# Altium footprint library 13-IC Packages-2smt4e.PcbLib: 49 footprints (part 2 of 4)
Each footprint in its own frame and in the unit in brackets; x right, y up, seen from the top. Pads: shape width x height; smd on the part's side, far side on the other; paste and mask are expansions set on the pad; w line width, h text height; cw(c..) or ccw(c..) is an arc to the next point about the centre after c.
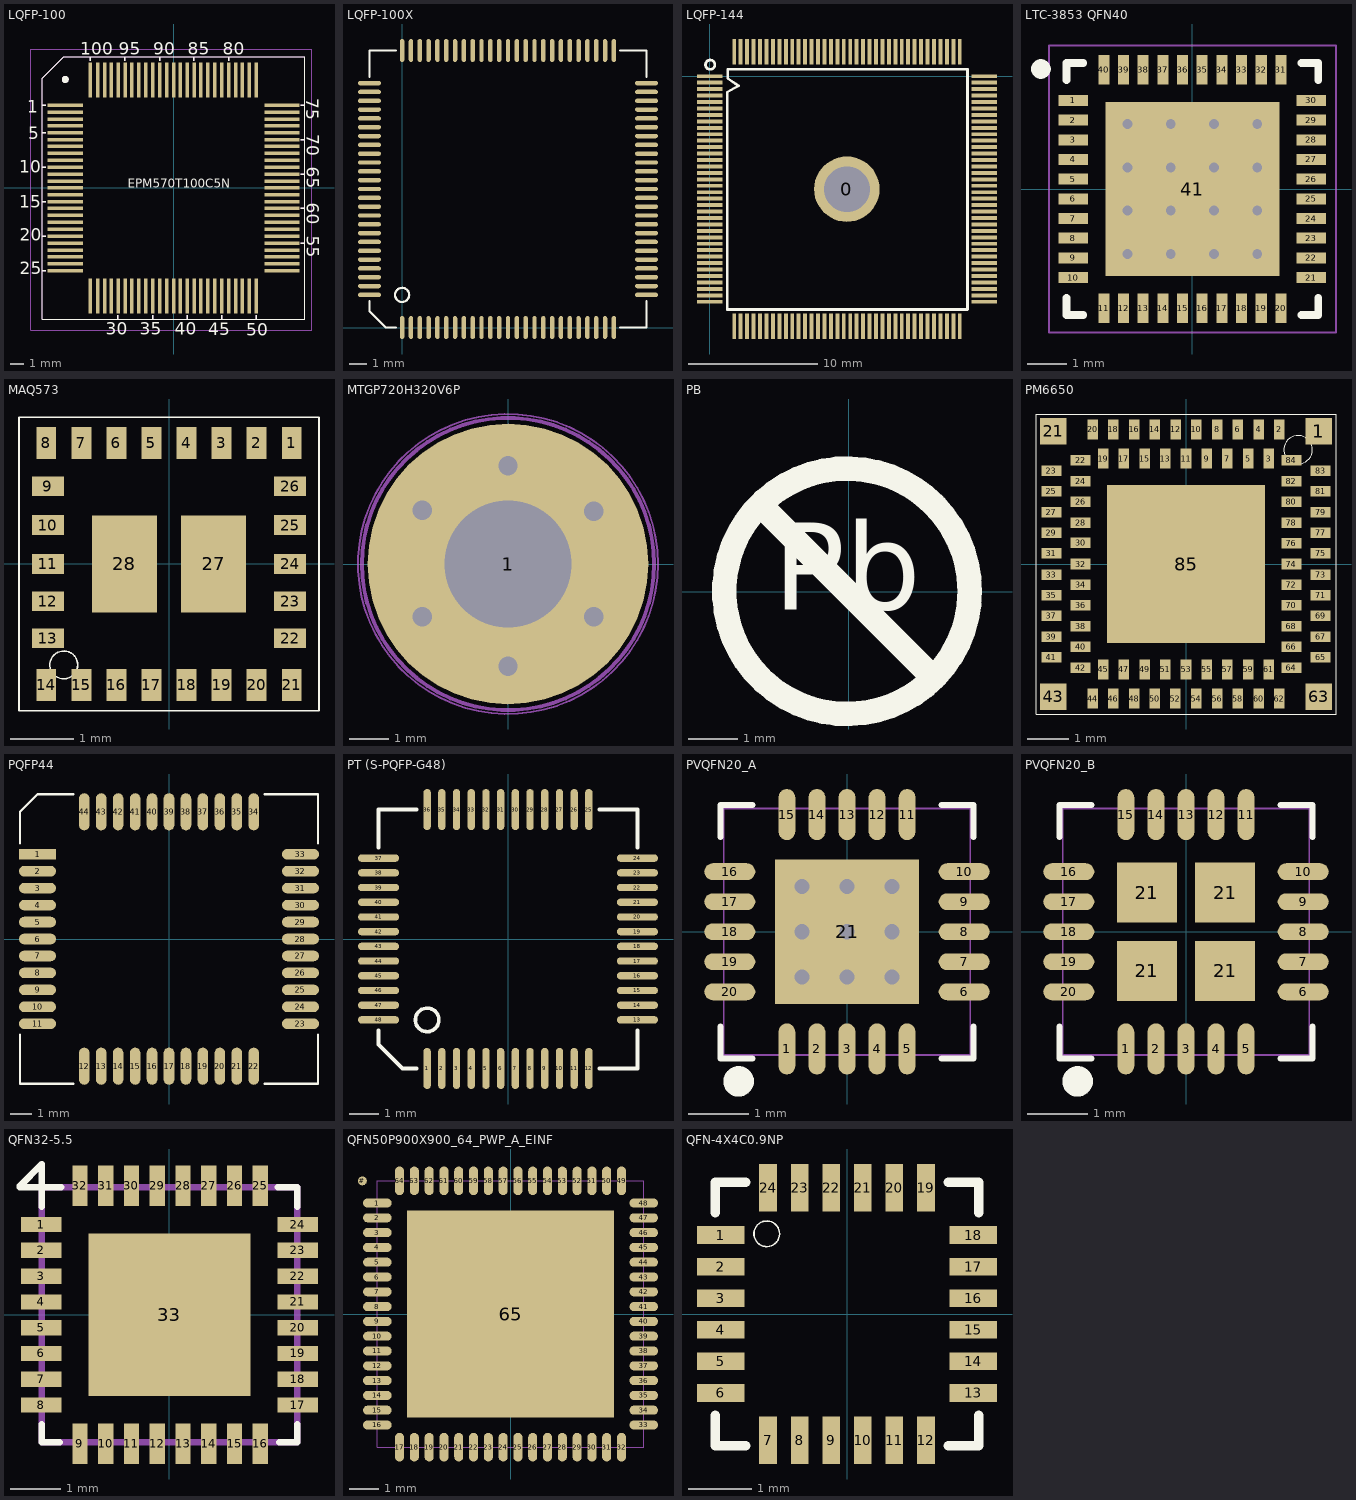
[diagram p1: the footprints below, top view; thin cyan lines are the x and y axes]

## LQFP-100 [mil]
pads (100):
  rect 100x10 smd: 1(-309.02,236.5) 2(-309.02,216.5) 3(-309.02,196.5) 4(-309.02,177.48) 5(-309.02,157.48) 6(-309.02,137.48) 7(-309.02,118.5) 8(-309.02,98.5) 9(-309.02,78.5) 10(-309.02,59.49) 11(-309.02,39.49) 12(-309.02,19.49) 13(-309.02,0.51) 14(-309.02,-19.49) 15(-309.02,-39.49) 16(-309.02,-58.5) 17(-309.02,-78.5) 18(-309.02,-98.5) 19(-309.02,-118.5) 20(-309.02,-137.48) 21(-309.02,-157.48) 22(-309.02,-177.48) 23(-309.02,-196.5) 24(-309.02,-216.5) 25(-309.02,-236.5) 51(309.02,-236.5) 52(309.02,-216.5) 53(309.02,-196.5) 54(309.02,-177.48) 55(309.02,-157.48) 56(309.02,-137.48) 57(309.02,-118.5) 58(309.02,-98.5) 59(309.02,-78.5) 60(309.02,-58.5) 61(309.02,-39.49) 62(309.02,-19.49) 63(309.02,0.51) 64(309.02,19.49) 65(309.02,39.49) 66(309.02,59.49) 67(309.02,78.5) 68(309.02,98.5) 69(309.02,118.5) 70(309.02,137.48) 71(309.02,157.48) 72(309.02,177.48) 73(309.02,196.5) 74(309.02,216.5) 75(309.02,236.5)
  rect 10x100 smd: 26(-237.01,-308.5) 27(-217.01,-308.5) 28(-197.01,-308.5) 29(-177.99,-308.5) 30(-157.99,-308.5) 31(-137.99,-308.5) 32(-119.02,-308.5) 33(-99.02,-308.5) 34(-79.02,-308.5) 35(-59.02,-308.5) 36(-40,-308.5) 37(-20,-308.5) 38(0,-308.5) 39(19.02,-308.5) 40(39.02,-308.5) 41(59.02,-308.5) 42(77.99,-308.5) 43(97.99,-308.5) 44(117.99,-308.5) 45(137.01,-308.5) 46(157.01,-308.5) 47(177.01,-308.5) 48(195.98,-308.5) 49(215.98,-308.5) 50(235.98,-308.5) 76(235.98,308.5) 77(215.98,308.5) 78(195.98,308.5) 79(177.01,308.5) 80(157.01,308.5) 81(137.01,308.5) 82(117.99,308.5) 83(97.99,308.5) 84(77.99,308.5) 85(59.02,308.5) 86(39.02,308.5) 87(19.02,308.5) 88(0,308.5) 89(-20,308.5) 90(-40,308.5) 91(-59.02,308.5) 92(-79.02,308.5) 93(-99.02,308.5) 94(-119.02,308.5) 95(-137.99,308.5) 96(-157.99,308.5) 97(-177.99,308.5) 98(-197.01,308.5) 99(-217.01,308.5) 100(-237.01,308.5)
Top Overlay:
  circle w10: c-309.01,309.5 r4.99
  lines w2.01: -375,-374.49 -375,312.52 -312.99,374.49 373.98,374.49 373.98,-374.49 -375,-374.49
  lines w4.02: -375,157.52 -365,157.52 ; -375,236.5 -365,236.5 ; -374.02,-236.5 -364.02,-236.5 ; -374.02,-137.48 -364.02,-137.48 ; -374.02,-39.49 -364.02,-39.49 ; -374.02,59.49 -364.02,59.49 ; -237.99,363.5 -237.99,373.5 ; -159.02,-373.5 -159.02,-363.5 ; -139.02,363.5 -139.02,373.5 ; -59.02,-373.5 -59.02,-363.5 ; -40,363.5 -40,373.5 ; 38.98,-373.5 38.98,-363.5 ; 57.99,363.5 57.99,373.5 ; 137.01,-373.5 137.01,-363.5 ; 157.01,363.5 157.01,373.5 ; 235.98,-373.5 235.98,-363.5 ; 362.99,-157.48 372.99,-157.48 ; 362.99,-58.5 372.99,-58.5 ; 362.99,39.49 372.99,39.49 ; 362.99,137.52 372.99,137.52 ; 362.99,236.5 372.99,236.5
  text "70" at 380,152.52 h35
  text "65" at 380,60.51 h35
  text "10" at -441.02,43.5 h35
  text "5" at -415,138.5 h35
  text "85" at 40,379.49 h35
  text "80" at 140,380.51 h35
  text "40" at 3.98,-419.49 h35
  text "95" at -157.01,380.51 h35
  text "90" at -57.99,379.49 h35
  text "75" at 377.99,256.5 h35
  text "60" at 380,-42.48 h35
  text "55" at 380,-136.5 h35
  text "50" at 207.01,-421.5 h35
  text "45" at 98.98,-420.51 h35
  text "35" at -96.02,-419.49 h35
  text "30" at -194.02,-419.49 h35
  text "25" at -439.02,-246.5 h35
  text "20" at -439.02,-150.51 h35
  text "15" at -440,-56.5 h35
  text "1" at -417.01,214.49 h35
  text "100" at -266.02,380.51 h35
  text "EPM570T100C5N" at -130,0 h25
Mechanical 7:
  text "50" at 215.98,-308.5 h25
  text "14" at -329.02,-19.49 h25
  text "31" at -157.99,-308.5 h25
  text "45" at 117.01,-308.5 h25
  text "39" at -1.02,-308.5 h25
  text "9" at -319.02,78.5 h25
  text "13" at -329.02,0.51 h25
  text "63" at 288.98,0.51 h25
  text "59" at 288.98,-78.5 h25
  text "88" at -20,308.5 h25
  text "94" at -139.02,308.5 h25
  text "80" at 137.01,308.5 h25
  text "75" at 288.98,236.5 h25
  text "74" at 288.98,216.5 h25
  text "62" at 288.98,-19.49 h25
  text "12" at -329.02,19.49 h25
  text "52" at 288.98,-216.5 h25
  text "40" at 18.98,-308.5 h25
  text "68" at 288.98,98.5 h25
  text "69" at 288.98,118.5 h25
  text "70" at 288.98,137.52 h25
  text "71" at 288.98,157.52 h25
  text "72" at 288.98,177.52 h25
  text "73" at 288.98,196.5 h25
  text "92" at -99.02,308.5 h25
  text "91" at -79.02,308.5 h25
  text "77" at 195.98,308.5 h25
  text "36" at -60,-308.5 h25
  text "6" at -319.02,137.52 h25
  text "79" at 157.01,308.5 h25
  text "90" at -60,308.5 h25
  text "93" at -119.02,308.5 h25
  text "11" at -329.02,39.49 h25
  text "32" at -139.02,-308.5 h25
  text "46" at 137.01,-308.5 h25
  text "37" at -40,-308.5 h25
  text "10" at -329.02,59.49 h25
  text "65" at 288.98,39.49 h25
  text "60" at 288.98,-58.5 h25
  text "2" at -319.02,216.5 h25
  text "85" at 38.98,308.5 h25
  text "17" at -329.02,-78.5 h25
  text "82" at 97.99,308.5 h25
  text "16" at -329.02,-58.5 h25
  text "86" at 18.98,308.5 h25
  text "19" at -329.02,-118.5 h25
  text "84" at 57.99,308.5 h25
  text "24" at -329.02,-216.5 h25
  text "23" at -329.02,-196.5 h25
  text "25" at -329.02,-236.5 h25
  text "22" at -329.02,-177.48 h25
  text "55" at 288.98,-157.48 h25
  text "57" at 288.98,-118.5 h25
  text "58" at 288.98,-98.5 h25
  text "99" at -237.01,308.5 h25
  text "95" at -157.99,308.5 h25
  text "44" at 97.99,-308.5 h25
  text "43" at 77.99,-308.5 h25
  text "66" at 288.98,59.49 h25
  text "67" at 288.98,78.5 h25
  text "47" at 157.01,-308.5 h25
  text "48" at 175.98,-308.5 h25
  text "89" at -40,308.5 h25
  text "38" at -20,-308.5 h25
  text "54" at 288.98,-177.48 h25
  text "56" at 288.98,-137.48 h25
  text "61" at 288.98,-39.49 h25
  text "51" at 288.98,-236.5 h25
  text "78" at 175.98,308.5 h25
  text "35" at -79.02,-308.5 h25
  text "34" at -99.02,-308.5 h25
  text "29" at -197.99,-308.5 h25
  text "27" at -237.01,-308.5 h25
  text "28" at -217.01,-308.5 h25
  text "33" at -119.02,-308.5 h25
  text "20" at -329.02,-137.48 h25
  text "21" at -329.02,-157.48 h25
  text "98" at -217.01,308.5 h25
  text "42" at 57.99,-308.5 h25
  text "76" at 215.98,308.5 h25
  text "41" at 38.98,-308.5 h25
  text "15" at -329.02,-39.49 h25
  text "87" at -1.02,308.5 h25
  text "18" at -329.02,-98.5 h25
  text "83" at 77.99,308.5 h25
  text "8" at -319.02,98.5 h25
  text "7" at -319.02,118.5 h25
  text "5" at -319.02,157.52 h25
  text "4" at -319.02,177.52 h25
  text "3" at -319.02,196.5 h25
  text "1" at -319.02,236.5 h25
  text "26" at -257.01,-308.5 h25
  text "100" at -267.01,308.5 h25
  text "97" at -197.99,308.5 h25
  text "30" at -177.99,-308.5 h25
  text "96" at -177.99,308.5 h25
  text "81" at 117.01,308.5 h25
  text "49" at 195.98,-308.5 h25
  text "53" at 288.98,-196.5 h25
  text "64" at 288.98,19.49 h25
Mechanical 9:
  lines w1: -407.01,-406.5 395,-406.5 395,395.51 -407.01,395.51 -407.01,-406.5
Mechanical 10:
  lines w2.01: -375,-374.49 373.98,-374.49 373.98,374.49 -312.99,374.49 -375,312.52 -375,-374.49
  lines w4.02: -375,157.52 -365,157.52 ; -375,236.5 -365,236.5 ; -374.02,-236.5 -364.02,-236.5 ; -374.02,-137.48 -364.02,-137.48 ; -374.02,-39.49 -364.02,-39.49 ; -374.02,59.49 -364.02,59.49 ; -237.99,363.5 -237.99,373.5 ; -159.02,-373.5 -159.02,-363.5 ; -139.02,363.5 -139.02,373.5 ; -59.02,-373.5 -59.02,-363.5 ; -40,363.5 -40,373.5 ; 38.98,-373.5 38.98,-363.5 ; 57.99,363.5 57.99,373.5 ; 137.01,-373.5 137.01,-363.5 ; 157.01,363.5 157.01,373.5 ; 235.98,-373.5 235.98,-363.5 ; 362.99,-157.48 372.99,-157.48 ; 362.99,-58.5 372.99,-58.5 ; 362.99,39.49 372.99,39.49 ; 362.99,137.52 372.99,137.52 ; 362.99,236.5 372.99,236.5
  lines w10: -314,309.5 ccw(c-309.01,309.51) -309.01,304.52 ccw(c-309.01,309.51) -304.02,309.5 ccw(c-309.01,309.5) -309.01,314.49 ccw(c-309.01,309.5) -314,309.5
  text "100" at -266.02,380.51 h35
  text "1" at -417.01,214.49 h35
  text "15" at -440,-56.5 h35
  text "20" at -439.02,-150.51 h35
  text "25" at -439.02,-246.5 h35
  text "30" at -194.02,-419.49 h35
  text "35" at -96.02,-419.49 h35
  text "45" at 98.98,-420.51 h35
  text "50" at 207.01,-421.5 h35
  text "55" at 380,-136.5 h35
  text "60" at 380,-42.48 h35
  text "75" at 377.99,256.5 h35
  text "90" at -57.99,379.49 h35
  text "95" at -157.01,380.51 h35
  text "40" at 3.98,-419.49 h35
  text "80" at 140,380.51 h35
  text "85" at 40,379.49 h35
  text "5" at -415,138.5 h35
  text "10" at -441.02,43.5 h35
  text "65" at 380,60.51 h35
  text "70" at 380,152.52 h35
Mechanical 11:
  lines w1: -407.01,-406.5 395,-406.5 395,395.51 -407.01,395.51 -407.01,-406.5
3D body "lqfp-100.stp": height 62.99, standoff 0.05, extent -313.95,-315.96 315.97,313.96

## LQFP-100X [mm] "STM32107V.."
pads (100):
  oval 0.25x1.3 smd: 1(0,0) 2(0.5,0) 3(1,0) 4(1.5,0) 5(2,0) 6(2.5,0) 7(3,0) 8(3.5,0) 9(4,0) 10(4.5,0) 11(5,0) 12(5.5,0) 13(6,0) 14(6.5,0) 15(7,0) 16(7.5,0) 17(8,0) 18(8.5,0) 19(9,0) 20(9.5,0) 21(10,0) 22(10.5,0) 23(11,0) 24(11.5,0) 25(12,0) 51(12,15.7) 52(11.5,15.7) 53(11,15.7) 54(10.5,15.7) 55(10,15.7) 56(9.5,15.7) 57(9,15.7) 58(8.5,15.7) 59(8,15.7) 60(7.5,15.7) 61(7,15.7) 62(6.5,15.7) 63(6,15.7) 64(5.5,15.7) 65(5,15.7) 66(4.5,15.7) 67(4,15.7) 68(3.5,15.7) 69(3,15.7) 70(2.5,15.7) 71(2,15.7) 72(1.5,15.7) 73(1,15.7) 74(0.5,15.7) 75(0,15.7)
  oval 1.3x0.25 smd: 26(13.85,1.85) 27(13.85,2.35) 28(13.85,2.85) 29(13.85,3.35) 30(13.85,3.85) 31(13.85,4.35) 32(13.85,4.85) 33(13.85,5.35) 34(13.85,5.85) 35(13.85,6.35) 36(13.85,6.85) 37(13.85,7.35) 38(13.85,7.85) 39(13.85,8.35) 40(13.85,8.85) 41(13.85,9.35) 42(13.85,9.85) 43(13.85,10.35) 44(13.85,10.85) 45(13.85,11.35) 46(13.85,11.85) 47(13.85,12.35) 48(13.85,12.85) 49(13.85,13.35) 50(13.85,13.85) 76(-1.85,13.85) 77(-1.85,13.35) 78(-1.85,12.85) 79(-1.85,12.35) 80(-1.85,11.85) 81(-1.85,11.35) 82(-1.85,10.85) 83(-1.85,10.35) 84(-1.85,9.85) 85(-1.85,9.35) 86(-1.85,8.85) 87(-1.85,8.35) 88(-1.85,7.85) 89(-1.85,7.35) 90(-1.85,6.85) 91(-1.85,6.35) 92(-1.85,5.85) 93(-1.85,5.35) 94(-1.85,4.85) 95(-1.85,4.35) 96(-1.85,3.85) 97(-1.85,3.35) 98(-1.85,2.85) 99(-1.85,2.35) 100(-1.85,1.85)
Top Overlay:
  circle w0.127: c0,1.85 r0.4
  lines w0.127: -1.85,1.5 -1.85,0.92 -0.93,0 -0.35,0 ; -1.85,14.2 -1.85,15.7 -0.35,15.7 ; 12.35,0 13.85,0 13.85,1.5 ; 12.35,15.7 13.85,15.7 13.85,14.2
3D body "lqfp-100.stp": height 1.6, standoff 0, extent -2.005,-0.151 13.995,15.849

## LQFP-144 [mil]
pads (145):
  round 200 hole 140: 0(418.8,-345.07)
  rect 78x12 smd: 1(0,0) 2(0,-19.68) 3(0,-39.37) 4(0,-59.05) 5(0,-78.74) 6(0,-98.42) 7(0,-118.11) 8(0,-137.79) 9(0,-157.48) 10(0,-177.16) 11(0,-196.85) 12(0,-216.53) 13(0,-236.22) 14(0,-255.91) 15(0,-275.59) 16(0,-295.27) 17(0,-314.96) 18(0,-334.64) 19(0,-354.33) 20(0,-374.01) 21(0,-393.7) 22(0,-413.38) 23(0,-433.07) 24(0,-452.75) 25(0,-472.44) 26(0,-492.12) 27(0,-511.81) 28(0,-531.5) 29(0,-551.18) 30(0,-570.87) 31(0,-590.55) 32(0,-610.24) 33(0,-629.92) 34(0,-649.61) 35(0,-669.29) 36(0,-688.98) 73(838.58,-688.98) 74(838.58,-669.29) 75(838.58,-649.61) 76(838.58,-629.92) 77(838.58,-610.24) 78(838.58,-590.55) 79(838.58,-570.87) 80(838.58,-551.18) 81(838.58,-531.5) 82(838.58,-511.81) 83(838.58,-492.12) 84(838.58,-472.44) 85(838.58,-452.75) 86(838.58,-433.07) 87(838.58,-413.38) 88(838.58,-393.7) 89(838.58,-374.01) 90(838.58,-354.33) 91(838.58,-334.64) 92(838.58,-314.96) 93(838.58,-295.27) 94(838.58,-275.59) 95(838.58,-255.91) 96(838.58,-236.22) 97(838.58,-216.53) 98(838.58,-196.85) 99(838.58,-177.16) 100(838.58,-157.48) 101(838.58,-137.79) 102(838.58,-118.11) 103(838.58,-98.42) 104(838.58,-78.74) 105(838.58,-59.05) 106(838.58,-39.37) 107(838.58,-19.68) 108(838.58,0)
  rect 12x78 smd: 37(74.8,-763.78) 38(94.49,-763.78) 39(114.17,-763.78) 40(133.86,-763.78) 41(153.54,-763.78) 42(173.23,-763.78) 43(192.91,-763.78) 44(212.6,-763.78) 45(232.28,-763.78) 46(251.97,-763.78) 47(271.65,-763.78) 48(291.34,-763.78) 49(311.02,-763.78) 50(330.71,-763.78) 51(350.39,-763.78) 52(370.08,-763.78) 53(389.76,-763.78) 54(409.45,-763.78) 55(429.13,-763.78) 56(448.82,-763.78) 57(468.5,-763.78) 58(488.19,-763.78) 59(507.87,-763.78) 60(527.56,-763.78) 61(547.24,-763.78) 62(566.93,-763.78) 63(586.61,-763.78) 64(606.3,-763.78) 65(625.98,-763.78) 66(645.67,-763.78) 67(665.35,-763.78) 68(685.04,-763.78) 69(704.72,-763.78) 70(724.41,-763.78) 71(744.09,-763.78) 72(763.78,-763.78) 109(763.78,74.8) 110(744.09,74.8) 111(724.41,74.8) 112(704.72,74.8) 113(685.04,74.8) 114(665.35,74.8) 115(645.67,74.8) 116(625.98,74.8) 117(606.3,74.8) 118(586.61,74.8) 119(566.93,74.8) 120(547.24,74.8) 121(527.56,74.8) 122(507.87,74.8) 123(488.19,74.8) 124(468.5,74.8) 125(448.82,74.8) 126(429.13,74.8) 127(409.45,74.8) 128(389.76,74.8) 129(370.08,74.8) 130(350.39,74.8) 131(330.71,74.8) 132(311.02,74.8) 133(291.34,74.8) 134(271.65,74.8) 135(251.97,74.8) 136(232.28,74.8) 137(212.6,74.8) 138(192.91,74.8) 139(173.23,74.8) 140(153.54,74.8) 141(133.86,74.8) 142(114.17,74.8) 143(94.49,74.8) 144(74.8,74.8)
Top Overlay:
  circle w8: c1.42,35.27 r14.34
  lines w8: 53.03,-712.66 787.61,-712.66 787.61,-180.71 787.61,21.71 55.26,21.71 55.26,-6.63 87.85,-28.89 53.03,-48.33 53.03,-712.66
3D body "quad144.stp": height 59.06, standoff 0, extent -14.07,-778.08 852.08,88.07

## LTC-3853 QFN40 [mm]
pads (41):
  rect 0.75x0.28 smd: 1(-3.025,2.25) 2(-3.025,1.75) 3(-3.025,1.25) 4(-3.025,0.75) 5(-3.025,0.25) 6(-3.025,-0.25) 7(-3.025,-0.75) 8(-3.025,-1.25) 9(-3.025,-1.75) 10(-3.025,-2.25) 21(3.025,-2.25) 22(3.025,-1.75) 23(3.025,-1.25) 24(3.025,-0.75) 25(3.025,-0.25) 26(3.025,0.25) 27(3.025,0.75) 28(3.025,1.25) 29(3.025,1.75) 30(3.025,2.25)
  rect 0.28x0.75 smd: 11(-2.25,-3.025) 12(-1.75,-3.025) 13(-1.25,-3.025) 14(-0.75,-3.025) 15(-0.25,-3.025) 16(0.25,-3.025) 17(0.75,-3.025) 18(1.25,-3.025) 19(1.75,-3.025) 20(2.25,-3.025) 31(2.25,3.025) 32(1.75,3.025) 33(1.25,3.025) 34(0.75,3.025) 35(0.25,3.025) 36(-0.25,3.025) 37(-0.75,3.025) 38(-1.25,3.025) 39(-1.75,3.025) 40(-2.25,3.025)
  rect 4.42x4.42 smd: 41(0,0)
via -1.65,1.65 diameter 0.5 hole 0.25
via -0.55,1.65 diameter 0.5 hole 0.25
via 0.55,1.65 diameter 0.5 hole 0.25
via 1.65,1.65 diameter 0.5 hole 0.25
via -1.65,0.55 diameter 0.5 hole 0.25
via -0.55,0.55 diameter 0.5 hole 0.25
via 0.55,0.55 diameter 0.5 hole 0.25
via 1.65,0.55 diameter 0.5 hole 0.25
via -1.65,-0.55 diameter 0.5 hole 0.25
via -0.55,-0.55 diameter 0.5 hole 0.25
via 0.55,-0.55 diameter 0.5 hole 0.25
via 1.65,-0.55 diameter 0.5 hole 0.25
via -1.65,-1.65 diameter 0.5 hole 0.25
via -0.55,-1.65 diameter 0.5 hole 0.25
via 0.55,-1.65 diameter 0.5 hole 0.25
via 1.65,-1.65 diameter 0.5 hole 0.25
Top Overlay:
  circle w0.25: c-3.85,3.05 r0.125
  lines w0.2: -3.2,-2.775 -3.2,-3.2 -2.775,-3.2 ; -3.2,2.775 -3.2,3.2 -2.775,3.2 ; 2.775,-3.2 3.2,-3.2 3.2,-2.775 ; 2.775,3.2 3.2,3.2 3.2,2.775
Mechanical 15:
  lines w0.05: -3.65,-3.65 -3.65,3.65 3.65,3.65 3.65,-3.65 -3.65,-3.65
  lines w0.1: -0.5,0 0.5,0 ; 0,-0.5 0,0.5
3D body "qfn-6x6.stp": height 0.75, standoff 0, extent -3.036,-3.017 3.036,3.017
3D body "0_25-0_65.stp": height 0.02, standoff 0, extent -3.399,1.628 -2.749,1.878
3D body "0_25-0_65.stp": height 0.02, standoff 0, extent -3.399,2.128 -2.749,2.378
3D body "0_25-0_65.stp": height 0.02, standoff 0, extent -3.399,1.128 -2.749,1.378
3D body "0_25-0_65.stp": height 0.02, standoff 0, extent -3.399,0.628 -2.749,0.878
3D body "0_25-0_65.stp": height 0.02, standoff 0, extent -3.399,0.128 -2.749,0.378
3D body "0_25-0_65.stp": height 0.02, standoff 0, extent -3.399,-0.372 -2.749,-0.122
3D body "0_25-0_65.stp": height 0.02, standoff 0, extent -3.399,-0.872 -2.749,-0.622
3D body "0_25-0_65.stp": height 0.02, standoff 0, extent -3.399,-1.372 -2.749,-1.122
3D body "0_25-0_65.stp": height 0.02, standoff 0, extent -3.399,-1.872 -2.749,-1.622
3D body "0_25-0_65.stp": height 0.02, standoff 0, extent -3.399,-2.372 -2.749,-2.122
3D body "0_25-0_65.stp": height 0.02, standoff 0, extent -2.378,-3.399 -2.128,-2.749
3D body "0_25-0_65.stp": height 0.02, standoff 0, extent -1.878,-3.399 -1.628,-2.749
3D body "0_25-0_65.stp": height 0.02, standoff 0, extent -1.378,-3.399 -1.128,-2.749
3D body "0_25-0_65.stp": height 0.02, standoff 0, extent -0.878,-3.399 -0.628,-2.749
3D body "0_25-0_65.stp": height 0.02, standoff 0, extent -0.378,-3.399 -0.128,-2.749
3D body "0_25-0_65.stp": height 0.02, standoff 0, extent 0.122,-3.399 0.372,-2.749
3D body "0_25-0_65.stp": height 0.02, standoff 0, extent 0.622,-3.399 0.872,-2.749
3D body "0_25-0_65.stp": height 0.02, standoff 0, extent 1.122,-3.399 1.372,-2.749
3D body "0_25-0_65.stp": height 0.02, standoff 0, extent 1.622,-3.399 1.872,-2.749
3D body "0_25-0_65.stp": height 0.02, standoff 0, extent 2.122,-3.399 2.372,-2.749
3D body "0_25-0_65.stp": height 0.02, standoff 0, extent 2.749,-2.378 3.399,-2.128
3D body "0_25-0_65.stp": height 0.02, standoff 0, extent 2.749,-1.878 3.399,-1.628
3D body "0_25-0_65.stp": height 0.02, standoff 0, extent 2.749,-1.378 3.399,-1.128
3D body "0_25-0_65.stp": height 0.02, standoff 0, extent 2.749,-0.878 3.399,-0.628
3D body "0_25-0_65.stp": height 0.02, standoff 0, extent 2.749,-0.378 3.399,-0.128
3D body "0_25-0_65.stp": height 0.02, standoff 0, extent 2.749,0.122 3.399,0.372
3D body "0_25-0_65.stp": height 0.02, standoff 0, extent 2.749,0.622 3.399,0.872
3D body "0_25-0_65.stp": height 0.02, standoff 0, extent 2.749,1.122 3.399,1.372
3D body "0_25-0_65.stp": height 0.02, standoff 0, extent 2.749,1.622 3.399,1.872
3D body "0_25-0_65.stp": height 0.02, standoff 0, extent 2.749,2.122 3.399,2.372
3D body "0_25-0_65.stp": height 0.02, standoff 0, extent 2.128,2.749 2.378,3.399
3D body "0_25-0_65.stp": height 0.02, standoff 0, extent 1.628,2.749 1.878,3.399
3D body "0_25-0_65.stp": height 0.02, standoff 0, extent 1.128,2.749 1.378,3.399
3D body "0_25-0_65.stp": height 0.02, standoff 0, extent 0.628,2.749 0.878,3.399
3D body "0_25-0_65.stp": height 0.02, standoff 0, extent 0.128,2.749 0.378,3.399
3D body "0_25-0_65.stp": height 0.02, standoff 0, extent -0.372,2.749 -0.122,3.399
3D body "0_25-0_65.stp": height 0.02, standoff 0, extent -0.872,2.749 -0.622,3.399
3D body "0_25-0_65.stp": height 0.02, standoff 0, extent -1.372,2.749 -1.122,3.399
3D body "0_25-0_65.stp": height 0.02, standoff 0, extent -1.872,2.749 -1.622,3.399
3D body "0_25-0_65.stp": height 0.02, standoff 0, extent -2.372,2.749 -2.122,3.399

## MAQ573 [mm]
pads (28):
  rect 0.31x0.5 smd: 1(1.925,1.9) 2(1.375,1.9) 3(0.825,1.9) 4(0.275,1.9) 5(-0.275,1.9) 6(-0.825,1.9) 7(-1.375,1.9) 8(-1.925,1.9) 14(-1.925,-1.9) 15(-1.375,-1.9) 16(-0.825,-1.9) 17(-0.275,-1.9) 19(0.825,-1.9)
  rect 0.5x0.31 smd mask+0.051: 9(-1.9,1.219) 23(1.9,-0.584) 24(1.9,0) 26(1.9,1.219)
  rect 0.5x0.31 smd: 10(-1.9,0.61) 11(-1.9,0) 12(-1.9,-0.584) 13(-1.9,-1.168) 22(1.9,-1.168) 25(1.9,0.61)
  rect 0.31x0.5 smd mask+0.051: 18(0.275,-1.9) 20(1.375,-1.9) 21(1.925,-1.9)
  rect 1.02x1.52 smd: 27(0.7,0) 28(-0.7,0)
Top Overlay:
  circle w0.025: c-1.651,-1.585 r0.219
  lines w0.025: -2.355,-2.304 -2.355,2.301 2.355,2.301 2.355,-2.304 -2.355,-2.304
3D body "ma-573.stp": height 1, standoff 0, extent -2.362,-2.311 2.338,2.289

## MTGP720H320V6P [mm]
pads (1):
  round 7.2 hole 3.25: 1(0,0)
via -2.2,-1.35 diameter 1 hole 0.5
via -2.2,1.375 diameter 1 hole 0.5
via 0,2.525 diameter 1 hole 0.5
via 2.2,1.35 diameter 1 hole 0.5
via 0,-2.625 diameter 1 hole 0.5
via 2.2,-1.35 diameter 1 hole 0.5
Mechanical 8:
  circle w0.1: c0,0 r2.6
  circle w0.1: c0,0 r3.75
  lines w0.1: -2.657,1.625 -2.224,1.375 ; -2.632,-1.6 -2.199,-1.35 ; -2.474,0.942 -2.224,1.375 ; -2.449,-0.917 -2.199,-1.35 ; -1.974,1.808 -2.224,1.375 ; -1.949,-1.783 -2.199,-1.35 ; -1.791,1.125 -2.224,1.375 ; -1.766,-1.1 -2.199,-1.35 ; -0.5,-2.625 0,-2.625 ; -0.5,0 0,0 ; -0.5,2.525 0,2.525 ; 0,-3.125 0,-2.625 ; 0,-2.125 0,-2.625 ; 0,-0.5 0,0 ; 0,0.5 0,0 ; 0,2.025 0,2.525 ; 0,3.025 0,2.525 ; 0.5,-2.625 0,-2.625 ; 0.5,0 0,0 ; 0.5,2.525 0,2.525 ; 1.766,-1.1 2.199,-1.35 ; 1.766,1.1 2.199,1.35 ; 1.949,-1.783 2.199,-1.35 ; 1.949,1.783 2.199,1.35 ; 2.449,-0.917 2.199,-1.35 ; 2.449,0.917 2.199,1.35 ; 2.632,-1.6 2.199,-1.35 ; 2.632,1.6 2.199,1.35
Mechanical 14:
  circle w0.1: c0,0 r3.75
Mechanical 15:
  circle w0.05: c0,0 r3.85
3D body "mtgp720h320v6p.stp": height 0.1, standoff -1.75, extent -3.627,-3.627 3.628,3.628

## PB [mm]
Top Overlay:
  circle w0.5: c-0.031,0.013 r2.5
  lines w0.5: -1.737,1.719 1.675,-1.693
  text "Pb" at -1.536,-0.948 h3.05
3D body "pb.stp": height 0.02, standoff 0, extent -2.725,-2.725 2.725,2.725

## PCBComponent_1 - duplicate [mm]

## PM6650 [mil]
pads (85):
  rect 25x25 smd: 1(125.98,125.98) 21(-125.98,125.98) 43(-125.98,-125.98) 63(125.98,-125.98)
  rect 10x19 smd: 2(88.58,127.95) 3(78.74,100) 4(68.9,127.95) 5(59.05,100) 6(49.21,127.95) 7(39.37,100) 8(29.53,127.95) 9(19.68,100) 10(9.84,127.95) 11(0,100) 12(-9.84,127.95) 13(-19.68,100) 14(-29.53,127.95) 15(-39.37,100) 16(-49.21,127.95) 17(-59.05,100) 18(-68.9,127.95) 19(-78.74,100) 20(-88.58,127.95) 44(-88.58,-127.95) 45(-78.74,-100) 46(-68.9,-127.95) 47(-59.05,-100) 48(-49.21,-127.95) 49(-39.37,-100) 50(-29.53,-127.95) 51(-19.68,-100) 52(-10,-127.95) 53(0,-100) 54(9.84,-127.95) 55(19.68,-100) 56(29.53,-127.95) 57(39.37,-100) 58(49.21,-127.95) 59(59.05,-100) 60(68.9,-127.95) 61(78.74,-100) 62(88.58,-127.95)
  rect 19x10 smd: 22(-100,98.43) 23(-127.95,88.58) 24(-100,78.74) 25(-127.95,68.9) 26(-100,59.05) 27(-127.95,49.21) 28(-100,39.37) 29(-127.95,29.53) 30(-100,20) 31(-127.95,10) 32(-100,0) 33(-127.95,-10) 34(-100,-19.68) 35(-127.95,-29.53) 36(-100,-39.37) 37(-127.95,-49.21) 38(-100,-59.05) 39(-127.95,-68.9) 40(-100,-78.74) 41(-127.95,-88.58) 42(-100,-98.42) 64(100,-98.42) 65(127.95,-88.58) 66(100,-78.74) 67(127.95,-68.9) 68(100,-59.05) 69(127.95,-49.21) 70(100,-39.37) 71(127.95,-29.53) 72(100,-19.68) 73(127.95,-10) 74(100,0) 75(127.95,10) 76(100,19.68) 77(127.95,29.53) 78(100,39.37) 79(127.95,49.21) 80(100,59.05) 81(127.95,68.9) 82(100,78.74) 83(127.95,88.58) 84(100,98.43)
  rect 150x150 smd: 85(0,0)
Top Overlay:
  circle w1: c106.5,108.5 r13.5
  lines w1: -142.5,-142.5 -142.5,142.5 142.5,142.5 142.5,-142.5 -142.5,-142.5
3D body "pm6650.stp": height 19.68, standoff 0, extent -143,-142 142.04,143.04

## PQFP44 [mm]
pads (44):
  rect 1.75x0.5 smd: 1(-6.2,4)
  oval 1.75x0.5 smd: 2(-6.2,3.2) 3(-6.2,2.4) 4(-6.2,1.6) 5(-6.2,0.8) 6(-6.2,0) 7(-6.2,-0.8) 8(-6.2,-1.6) 9(-6.2,-2.4) 10(-6.2,-3.2) 11(-6.2,-4) 23(6.2,-4) 24(6.2,-3.2) 25(6.2,-2.4) 26(6.2,-1.6) 27(6.2,-0.8) 28(6.2,0) 29(6.2,0.8) 30(6.2,1.6) 31(6.2,2.4) 32(6.2,3.2) 33(6.2,4)
  oval 0.5x1.75 smd: 12(-4,-6) 13(-3.2,-6) 14(-2.4,-6) 15(-1.6,-6) 16(-0.8,-6) 17(0,-6) 18(0.8,-6) 19(1.6,-6) 20(2.4,-6) 21(3.2,-6) 22(4,-6) 34(4,6) 35(3.2,6) 36(2.4,6) 37(1.6,6) 38(0.8,6) 39(0,6) 40(-0.8,6) 41(-1.6,6) 42(-2.4,6) 43(-3.2,6) 44(-4,6)
Top Overlay:
  lines w0.1: -7.025,-4.5 -7.025,-6.825 -4.5,-6.825 ; -7.025,4.5 -7.025,6 -6.2,6.825 -4.5,6.825 ; 4.5,-6.825 7.025,-6.825 7.025,-4.5 ; 4.5,6.825 7.025,6.825 7.025,4.5
3D body "lqfp-44.stp": height 1.6, standoff 0, extent -6.097,-6.1 6.098,6.1

## PT (S-PQFP-G48) [mm]
pads (48):
  oval 0.25x1.4 smd: 1(-2.75,-4.4) 2(-2.25,-4.4) 3(-1.75,-4.4) 4(-1.25,-4.4) 5(-0.75,-4.4) 6(-0.25,-4.4) 7(0.25,-4.4) 8(0.75,-4.4) 9(1.25,-4.4) 10(1.75,-4.4) 11(2.25,-4.4) 12(2.75,-4.4) 25(2.75,4.4) 26(2.25,4.4) 27(1.75,4.4) 28(1.25,4.4) 29(0.75,4.4) 30(0.25,4.4) 31(-0.25,4.4) 32(-0.75,4.4) 33(-1.25,4.4) 34(-1.75,4.4) 35(-2.25,4.4) 36(-2.75,4.4)
  oval 1.4x0.25 smd: 13(4.4,-2.75) 14(4.4,-2.25) 15(4.4,-1.75) 16(4.4,-1.25) 17(4.4,-0.75) 18(4.4,-0.25) 19(4.4,0.25) 20(4.4,0.75) 21(4.4,1.25) 22(4.4,1.75) 23(4.4,2.25) 24(4.4,2.75) 37(-4.4,2.75) 38(-4.4,2.25) 39(-4.4,1.75) 40(-4.4,1.25) 41(-4.4,0.75) 42(-4.4,0.25) 43(-4.4,-0.25) 44(-4.4,-0.75) 45(-4.4,-1.25) 46(-4.4,-1.75) 47(-4.4,-2.25) 48(-4.4,-2.75)
Top Overlay:
  circle w0.127: c-2.75,-2.75 r0.4
  lines w0.127: -4.4,-3.1 -4.4,-3.59 -3.59,-4.4 -3.1,-4.4 ; -4.4,3.1 -4.4,4.4 -3.1,4.4 ; 3.1,-4.4 4.4,-4.4 4.4,-3.1 ; 3.1,4.4 4.4,4.4 4.4,3.1
3D body "ptb-s-hlqfp-g48.stp": height 1.61, standoff -0.03, extent -4.6,-4.6 4.6,4.6

## PVQFN20_A [mm]
pads (30):
  oval 0.28x0.85 smd mask+0.07: 1(-1,-1.95) 2(-0.5,-1.95) 3(0,-1.95) 4(0.5,-1.95) 5(1,-1.95) 11(1,1.95) 12(0.5,1.95) 13(0,1.95) 14(-0.5,1.95) 15(-1,1.95)
  oval 0.85x0.28 smd mask+0.07: 6(1.95,-1) 7(1.95,-0.5) 8(1.95,0) 9(1.95,0.5) 10(1.95,1) 16(-1.95,1) 17(-1.95,0.5) 18(-1.95,0) 19(-1.95,-0.5) 20(-1.95,-1)
  rect 2.4x2.4 smd mask+0.07: 21(0,0)
  round 0.5 hole 0.25 mask+0.07: ""(-0.75,-0.75) ""(-0.75,0) ""(-0.75,0.75) ""(0,-0.75) ""(0,0) ""(0,0.75) ""(0.75,-0.75) ""(0.75,0) ""(0.75,0.75)
Top Overlay:
  circle w0.254: c-1.803,-2.489 r0.127
  lines w0.1: -2.108,-1.575 -2.108,-2.108 -1.575,-2.108 ; -2.108,1.575 -2.108,2.108 -1.575,2.108 ; 1.575,-2.108 2.108,-2.108 2.108,-1.575 ; 1.575,2.108 2.108,2.108 2.108,1.575
Mechanical 15:
  lines w0.03: -2.05,-2.05 -2.05,2.05 2.05,2.05 2.05,-2.05 -2.05,-2.05
3D body "pwfp_n20.stp": height 0.9, standoff 0, extent -2.06,-2.06 2.06,2.06
3D body "0_28-0_95.stp": height 0.01, standoff 0, extent -2.431,-1.13 -1.481,-0.851
3D body "0_28-0_95.stp": height 0.01, standoff 0, extent -2.405,-0.648 -1.455,-0.368
3D body "0_28-0_95.stp": height 0.01, standoff 0, extent -2.431,-0.14 -1.481,0.14
3D body "0_28-0_95.stp": height 0.01, standoff 0, extent -2.431,0.368 -1.481,0.648
3D body "0_28-0_95.stp": height 0.01, standoff 0, extent -2.431,0.851 -1.481,1.131
3D body "0_28-0_95.stp": height 0.01, standoff 0, extent -1.131,1.481 -0.851,2.431
3D body "0_28-0_95.stp": height 0.01, standoff 0, extent -0.648,1.481 -0.368,2.431
3D body "0_28-0_95.stp": height 0.01, standoff 0, extent -0.14,1.481 0.14,2.431
3D body "0_28-0_95.stp": height 0.01, standoff 0, extent 0.343,1.481 0.622,2.431
3D body "0_28-0_95.stp": height 0.01, standoff 0, extent 0.851,1.481 1.13,2.431
3D body "0_28-0_95.stp": height 0.01, standoff 0, extent 1.481,0.851 2.431,1.13
3D body "0_28-0_95.stp": height 0.01, standoff 0, extent 1.481,0.368 2.431,0.648
3D body "0_28-0_95.stp": height 0.01, standoff 0, extent 1.481,-0.14 2.431,0.14
3D body "0_28-0_95.stp": height 0.01, standoff 0, extent 1.481,-0.648 2.431,-0.368
3D body "0_28-0_95.stp": height 0.01, standoff 0, extent 1.481,-1.131 2.431,-0.851
3D body "0_28-0_95.stp": height 0.01, standoff 0, extent 0.851,-2.431 1.131,-1.481
3D body "0_28-0_95.stp": height 0.01, standoff 0, extent 0.343,-2.431 0.623,-1.481
3D body "0_28-0_95.stp": height 0.01, standoff 0, extent -0.14,-2.431 0.14,-1.481
3D body "0_28-0_95.stp": height 0.01, standoff 0, extent -0.648,-2.431 -0.368,-1.481
3D body "0_28-0_95.stp": height 0.01, standoff 0, extent -1.13,-2.431 -0.851,-1.481

## PVQFN20_B [mm]
pads (24):
  oval 0.28x0.85 smd mask+0.07: 1(-1,-1.95) 2(-0.5,-1.95) 3(0,-1.95) 4(0.5,-1.95) 5(1,-1.95) 11(1,1.95) 12(0.5,1.95) 13(0,1.95) 14(-0.5,1.95) 15(-1,1.95)
  oval 0.85x0.28 smd mask+0.07: 6(1.95,-1) 7(1.95,-0.5) 8(1.95,0) 9(1.95,0.5) 10(1.95,1) 16(-1.95,1) 17(-1.95,0.5) 18(-1.95,0) 19(-1.95,-0.5) 20(-1.95,-1)
  rect 1x1 smd mask+0.07: 21(-0.65,-0.65) 21(-0.65,0.65) 21(0.65,-0.65) 21(0.65,0.65)
Top Overlay:
  circle w0.254: c-1.803,-2.489 r0.127
  lines w0.1: -2.108,-1.575 -2.108,-2.108 -1.575,-2.108 ; -2.108,1.575 -2.108,2.108 -1.575,2.108 ; 1.575,-2.108 2.108,-2.108 2.108,-1.575 ; 1.575,2.108 2.108,2.108 2.108,1.575
Mechanical 15:
  lines w0.03: -2.05,-2.05 2.05,-2.05 2.05,2.05 -2.05,2.05 -2.05,-2.05
3D body "0_28-0_95.stp": height 0.01, standoff 0, extent -1.13,-2.431 -0.851,-1.481
3D body "0_28-0_95.stp": height 0.01, standoff 0, extent -0.648,-2.431 -0.368,-1.481
3D body "0_28-0_95.stp": height 0.01, standoff 0, extent -0.14,-2.431 0.14,-1.481
3D body "0_28-0_95.stp": height 0.01, standoff 0, extent 0.343,-2.438 0.623,-1.488
3D body "0_28-0_95.stp": height 0.01, standoff 0, extent 0.851,-2.431 1.131,-1.481
3D body "0_28-0_95.stp": height 0.01, standoff 0, extent 1.481,-1.131 2.431,-0.851
3D body "0_28-0_95.stp": height 0.01, standoff 0, extent 1.481,-0.648 2.431,-0.368
3D body "0_28-0_95.stp": height 0.01, standoff 0, extent 1.481,-0.14 2.431,0.14
3D body "0_28-0_95.stp": height 0.01, standoff 0, extent 1.481,0.343 2.431,0.622
3D body "0_28-0_95.stp": height 0.01, standoff 0, extent 1.481,0.851 2.431,1.13
3D body "0_28-0_95.stp": height 0.01, standoff 0, extent 0.851,1.481 1.13,2.431
3D body "0_28-0_95.stp": height 0.01, standoff 0, extent 0.368,1.481 0.648,2.431
3D body "0_28-0_95.stp": height 0.01, standoff 0, extent -0.14,1.481 0.14,2.431
3D body "0_28-0_95.stp": height 0.01, standoff 0, extent -0.648,1.481 -0.368,2.431
3D body "0_28-0_95.stp": height 0.01, standoff 0, extent -1.156,1.481 -0.876,2.431
3D body "0_28-0_95.stp": height 0.01, standoff 0, extent -2.431,0.851 -1.481,1.131
3D body "0_28-0_95.stp": height 0.01, standoff 0, extent -2.431,0.368 -1.481,0.648
3D body "0_28-0_95.stp": height 0.01, standoff 0, extent -2.431,-0.14 -1.481,0.14
3D body "0_28-0_95.stp": height 0.01, standoff 0, extent -2.431,-0.622 -1.481,-0.343
3D body "0_28-0_95.stp": height 0.01, standoff 0, extent -2.431,-1.13 -1.481,-0.851
3D body "pwfp_n20.stp": height 0.9, standoff 0, extent -2.06,-2.06 2.06,2.06

## QFN32-5.5 [mm]
pads (33):
  rect 0.8x0.3 smd: 1(-2.527,1.778) 2(-2.527,1.27) 3(-2.527,0.762) 4(-2.527,0.254) 5(-2.527,-0.254) 6(-2.527,-0.762) 7(-2.527,-1.27) 8(-2.527,-1.778) 17(2.527,-1.778) 18(2.527,-1.27) 19(2.527,-0.762) 20(2.527,-0.254) 21(2.527,0.254) 22(2.527,0.762) 23(2.527,1.27) 24(2.527,1.778)
  rect 0.3x0.8 smd: 9(-1.765,-2.54) 10(-1.257,-2.54) 11(-0.749,-2.54) 12(-0.241,-2.54) 13(0.267,-2.54) 14(0.775,-2.54) 15(1.283,-2.54) 16(1.791,-2.54) 25(1.791,2.54) 26(1.283,2.54) 27(0.775,2.54) 28(0.267,2.54) 29(-0.241,2.54) 30(-0.749,2.54) 31(-1.257,2.54) 32(-1.765,2.54)
  rect 3.2x3.2 smd mask+0.051: 33(0,0)
Top Overlay:
  lines w0.127: -2.946,2.515 -2.515,2.515 ; -2.946,2.54 -2.515,2.972 -2.515,2.54 -2.54,2.515 ; -2.515,-2.159 -2.515,-2.515 -2.159,-2.515 ; -2.515,2.134 -2.515,2.515 ; -2.134,2.515 -2.515,2.515 ; 2.134,2.515 2.515,2.515 2.515,2.134 ; 2.159,-2.515 2.515,-2.515 2.515,-2.159
Mechanical 15:
  lines w0.127: -2.515,-2.515 2.515,-2.515 2.515,2.515 -2.515,2.515 -2.515,-2.515
3D body "qfn32pad.stp": height 0, standoff 0, extent -1.978,2.14 -1.578,2.94
3D body "qfn32pad.stp": height 0, standoff 0, extent -1.47,2.14 -1.07,2.94
3D body "qfn32pad.stp": height 0, standoff 0, extent -0.962,2.14 -0.562,2.94
3D body "qfn32pad.stp": height 0, standoff 0, extent -0.454,2.14 -0.054,2.94
3D body "qfn32pad.stp": height 0, standoff 0, extent 0.054,2.14 0.454,2.94
3D body "qfn32pad.stp": height 0, standoff 0, extent 0.562,2.14 0.962,2.94
3D body "qfn32pad.stp": height 0, standoff 0, extent 1.07,2.14 1.47,2.94
3D body "qfn32pad.stp": height 0, standoff 0, extent 1.578,2.14 1.978,2.94
3D body "qfn32pad.stp": height 0, standoff 0, extent 2.14,1.578 2.94,1.978
3D body "qfn32pad.stp": height 0, standoff 0, extent 2.14,1.07 2.94,1.47
3D body "qfn32pad.stp": height 0, standoff 0, extent 2.14,0.562 2.94,0.962
3D body "qfn32pad.stp": height 0, standoff 0, extent 2.14,0.054 2.94,0.454
3D body "qfn32pad.stp": height 0, standoff 0, extent 2.14,-0.454 2.94,-0.054
3D body "qfn32pad.stp": height 0, standoff 0, extent 2.14,-0.962 2.94,-0.562
3D body "qfn32pad.stp": height 0, standoff 0, extent 2.14,-1.47 2.94,-1.07
3D body "qfn32pad.stp": height 0, standoff 0, extent 2.14,-1.978 2.94,-1.578
3D body "qfn32pad.stp": height 0, standoff 0, extent 1.578,-2.94 1.978,-2.14
3D body "qfn32pad.stp": height 0, standoff 0, extent 1.07,-2.94 1.47,-2.14
3D body "qfn32pad.stp": height 0, standoff 0, extent 0.562,-2.94 0.962,-2.14
3D body "qfn32pad.stp": height 0, standoff 0, extent 0.054,-2.94 0.454,-2.14
3D body "qfn32pad.stp": height 0, standoff 0, extent -0.454,-2.94 -0.054,-2.14
3D body "qfn32pad.stp": height 0, standoff 0, extent -0.962,-2.94 -0.562,-2.14
3D body "qfn32pad.stp": height 0, standoff 0, extent -1.47,-2.94 -1.07,-2.14
3D body "qfn32pad.stp": height 0, standoff 0, extent -1.978,-2.94 -1.578,-2.14
3D body "qfn32pad.stp": height 0, standoff 0, extent -2.94,-1.978 -2.14,-1.578
3D body "qfn32pad.stp": height 0, standoff 0, extent -2.94,-1.47 -2.14,-1.07
3D body "qfn32pad.stp": height 0, standoff 0, extent -2.94,-0.962 -2.14,-0.562
3D body "qfn32pad.stp": height 0, standoff 0, extent -2.94,-0.454 -2.14,-0.054
3D body "qfn32pad.stp": height 0, standoff 0, extent -2.94,0.054 -2.14,0.454
3D body "qfn32pad.stp": height 0, standoff 0, extent -2.94,0.562 -2.14,0.962
3D body "qfn32pad.stp": height 0, standoff 0, extent -2.94,1.07 -2.14,1.47
3D body "qfn32pad.stp": height 0, standoff 0, extent -2.94,1.578 -2.14,1.978
3D body "qfn32-5x5.stp": height 1, standoff 0, extent -2.538,-2.535 2.538,2.535

## QFN50P900X900_64_PWP_A_EINF [mil]
pads (66):
  oval 38x12 smd: 1(-177.17,147.64) 2(-177.17,127.95) 3(-177.17,108.27) 4(-177.17,88.58) 5(-177.17,68.9) 6(-177.17,49.21) 7(-177.17,29.53) 8(-177.17,9.84) 9(-177.17,-9.84) 10(-177.17,-29.53) 11(-177.17,-49.21) 12(-177.17,-68.9) 13(-177.17,-88.58) 14(-177.17,-108.27) 15(-177.17,-127.95) 16(-177.17,-147.64) 33(177.17,-147.64) 34(177.17,-127.95) 35(177.17,-108.27) 36(177.17,-88.58) 37(177.17,-68.9) 38(177.17,-49.21) 39(177.17,-29.53) 40(177.17,-9.84) 41(177.17,9.84) 42(177.17,29.53) 43(177.17,49.21) 44(177.17,68.9) 45(177.17,88.58) 46(177.17,108.27) 47(177.17,127.95) 48(177.17,147.64)
  oval 12x38 smd: 17(-147.64,-177.17) 18(-127.95,-177.17) 19(-108.27,-177.17) 20(-88.58,-177.17) 21(-68.9,-177.17) 22(-49.21,-177.17) 23(-29.53,-177.17) 24(-9.84,-177.17) 25(9.84,-177.17) 26(29.53,-177.17) 27(49.21,-177.17) 28(68.9,-177.17) 29(88.58,-177.17) 30(108.27,-177.17) 31(127.95,-177.17) 32(147.64,-177.17) 49(147.64,177.17) 50(127.95,177.17) 51(108.27,177.17) 52(88.58,177.17) 53(68.9,177.17) 54(49.21,177.17) 55(29.53,177.17) 56(9.84,177.17) 57(-9.84,177.17) 58(-29.53,177.17) 59(-49.21,177.17) 60(-68.9,177.17) 61(-88.58,177.17) 62(-108.27,177.17) 63(-127.95,177.17) 64(-147.64,177.17)
  rect 275.59x275.59 smd: 65(0,0)
  round 11.81 smd: #(-197,177)
Mechanical 15:
  lines w1: -177.17,-177.17 177.17,-177.17 177.17,177.17 -177.17,177.17 -177.17,-177.17
Mechanical 16:
  lines w1: -177.17,-177.17 -177.17,177.17 ; -177.17,-177.17 -177.17,177.17 ; -177.17,-177.17 177.17,-177.17 -177.17,-177.17 ; -177.17,177.17 177.17,177.17 -177.17,177.17
Mechanical 32:
  text "17" at -170.04,-177.17 h28
  text "16" at -199.57,-147.64 h28
  text "19" at -130.67,-177.17 h28
  text "20" at -110.98,-177.17 h28
  text "11" at -199.57,-49.21 h28
  text "14" at -199.57,-108.27 h28
  text "13" at -199.57,-88.58 h28
  text "12" at -199.57,-68.9 h28
  text "30" at 85.87,-177.17 h28
  text "29" at 66.18,-177.17 h28
  text "21" at -91.3,-177.17 h28
  text "53" at 46.5,177.17 h28
  text "23" at -51.93,-177.17 h28
  text "18" at -150.35,-177.17 h28
  text "15" at -199.57,-127.95 h28
  text "8" at -188.37,9.84 h28
  text "7" at -188.37,29.53 h28
  text "6" at -188.37,49.21 h28
  text "5" at -188.37,68.9 h28
  text "2" at -188.37,127.95 h28
  text "1" at -188.37,147.64 h28
  text "62" at -130.67,177.17 h28
  text "61" at -110.98,177.17 h28
  text "60" at -91.3,177.17 h28
  text "59" at -71.61,177.17 h28
  text "58" at -51.93,177.17 h28
  text "57" at -32.24,177.17 h28
  text "55" at 7.13,177.17 h28
  text "50" at 105.55,177.17 h28
  text "22" at -71.61,-177.17 h28
  text "41" at 154.77,9.84 h28
  text "36" at 154.77,-88.58 h28
  text "25" at -12.56,-177.17 h28
  text "48" at 154.77,147.64 h28
  text "33" at 154.77,-147.64 h28
  text "42" at 154.77,29.53 h28
  text "45" at 154.77,88.58 h28
  text "49" at 125.24,177.17 h28
  text "46" at 154.77,108.27 h28
  text "47" at 154.77,127.95 h28
  text "24" at -32.24,-177.17 h28
  text "52" at 66.18,177.17 h28
  text "51" at 85.87,177.17 h28
  text "34" at 154.77,-127.95 h28
  text "35" at 154.77,-108.27 h28
  text "31" at 105.55,-177.17 h28
  text "4" at -188.37,88.58 h28
  text "3" at -188.37,108.27 h28
  text "64" at -170.04,177.17 h28
  text "63" at -150.35,177.17 h28
  text "32" at 125.24,-177.17 h28
  text "38" at 154.77,-49.21 h28
  text "40" at 154.77,-9.84 h28
  text "43" at 154.77,49.21 h28
  text "56" at -12.56,177.17 h28
  text "9" at -188.37,-9.84 h28
  text "10" at -199.57,-29.53 h28
  text "54" at 26.81,177.17 h28
  text "37" at 154.77,-68.9 h28
  text "44" at 154.77,68.9 h28
  text "39" at 154.77,-29.53 h28
  text "65" at -22.4,0 h28
  text "28" at 46.5,-177.17 h28
  text "27" at 26.81,-177.17 h28
  text "26" at 7.13,-177.17 h28
  text "354.33" at 321.87,-31.95 h7.87
  text "9" at 344.06,-16.2 h7.87
  text "354.33" at -27.7,-338.49 h7.87
  text "9" at -5.51,-322.74 h7.87
  text "354.33" at -317.21,-3.27 h7.87
  text "9" at -295.02,12.48 h7.87
  text "354.33" at -26.8,291.62 h7.87
  text "9" at -4.61,307.37 h7.87
  text "19.69" at 259.08,16.45 h7.87
  text "0.5" at 267.96,32.2 h7.87
  text "19.69" at 26.94,-286.51 h7.87
  text "0.5" at 35.81,-270.76 h7.87
3D body "rgc_s-pvqfn-n64.stp": height 39.37, standoff 0, extent -180.31,-180.31 180.32,180.32

## QFN-4X4C0.9NP [mm]
pads (24):
  rect 0.75x0.28 smd mask+0.05: 1(-2,1.25) 2(-2,0.75) 3(-2,0.25) 4(-2,-0.25) 5(-2,-0.75) 6(-2,-1.25) 13(2,-1.25) 14(2,-0.75) 15(2,-0.25) 16(2,0.25) 17(2,0.75) 18(2,1.25)
  rect 0.28x0.75 smd mask+0.05: 7(-1.25,-2) 8(-0.75,-2) 9(-0.25,-2) 10(0.25,-2) 11(0.75,-2) 12(1.25,-2) 19(1.25,2) 20(0.75,2) 21(0.25,2) 22(-0.25,2) 23(-0.75,2) 24(-1.25,2)
Top Overlay:
  circle w0.025: c-1.27,1.27 r0.203
  lines w0.15: -2.083,-1.6 -2.083,-2.083 -1.6,-2.083 ; -2.083,1.6 -2.083,2.083 -1.6,2.083 ; 1.6,-2.083 2.083,-2.083 2.083,-1.6 ; 1.6,2.083 2.083,2.083 2.083,1.6
3D body "qfn-4x4.stp": height 0.85, standoff 0, extent -2.01,-2.01 2.01,2.01